# Altium footprint library con-amp.PCBLIB: 295 footprints (part 18 of 19)
Each footprint in its own frame and in the unit in brackets; x right, y up, seen from the top. Pads: shape width x height; smd on the part's side, far side on the other; paste and mask are expansions set on the pad; w line width, h text height; cw(c..) or ccw(c..) is an arc to the next point about the centre after c.
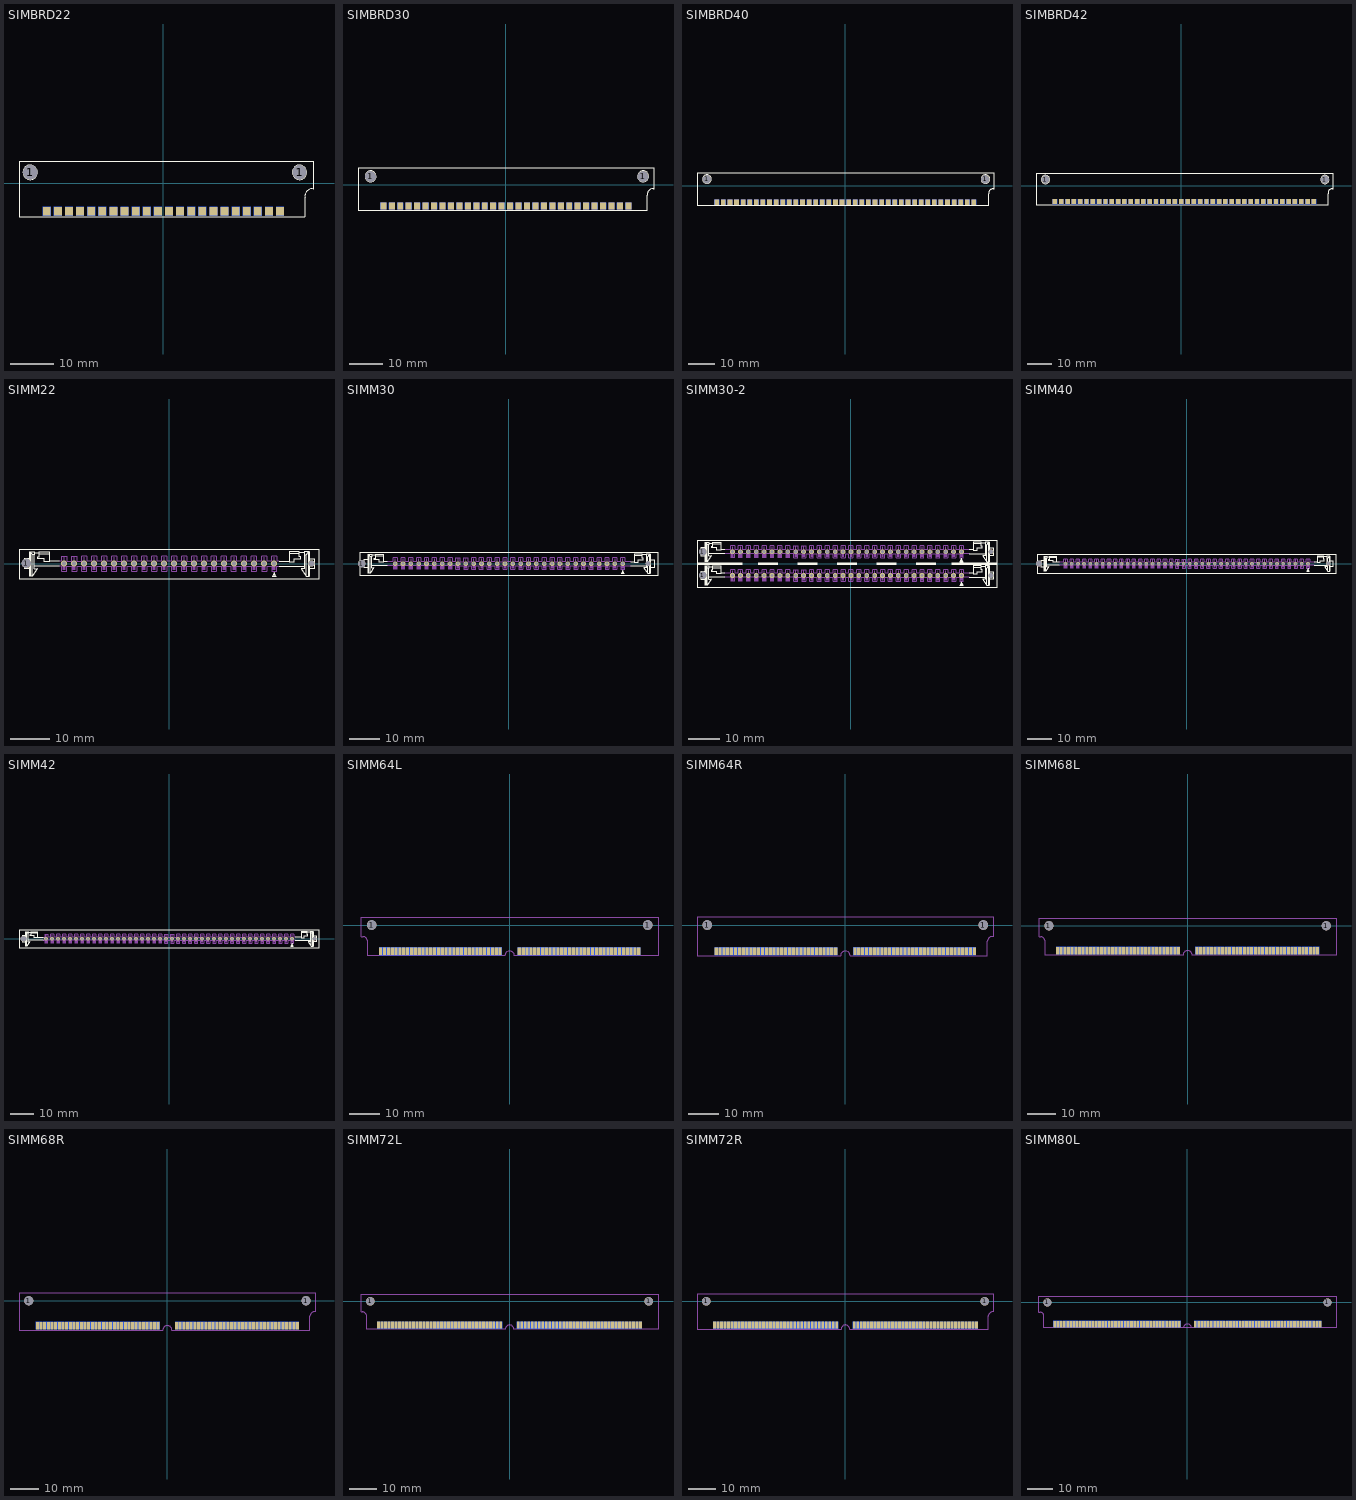
[diagram p17: the footprints below, top view; thin cyan lines are the x and y axes]

## SIMBRD22 [mil]
pads (46):
  round 130 hole 130: 1(-1200,100) 1(1225,100)
  rect 70x80 smd far side: 1B(1050,-250) 2B(950,-250) 3B(850,-250) 4B(750,-250) 5B(650,-250) 6B(550,-250) 7B(450,-250) 8B(350,-250) 9B(250,-250) 10B(150,-250) 11B(50,-250) 12B(-50,-250) 13B(-150,-250) 14B(-250,-250) 15B(-350,-250) 16B(-450,-250) 17B(-550,-250) 18B(-650,-250) 19B(-750,-250) 20B(-850,-250) 21B(-950,-250) 22B(-1050,-250)
  rect 70x80 smd: 1T(1050,-250) 2T(950,-250) 3T(850,-250) 4T(750,-250) 5T(650,-250) 6T(550,-250) 7T(450,-250) 8T(350,-250) 9T(250,-250) 10T(150,-250) 11T(50,-250) 12T(-50,-250) 13T(-150,-250) 14T(-250,-250) 15T(-350,-250) 16T(-450,-250) 17T(-550,-250) 18T(-650,-250) 19T(-750,-250) 20T(-850,-250) 21T(-950,-250) 22T(-1050,-250)
Top Overlay:
  circle w6: c1225,100 r65
  circle w6: c-1200,100 r65
  lines w6: 1274,-300 -1300,-300 -1300,200 1350,200 1350,-50 ccw(c1337,-112) 1275,-125 1275,-300
Mechanical 16:
  rectangle: -1085,-290 -1015,-210
  rectangle: -985,-290 -915,-210
  rectangle: -885,-290 -815,-210
  rectangle: -785,-290 -715,-210
  rectangle: -685,-290 -615,-210
  rectangle: -585,-290 -515,-210
  rectangle: -485,-290 -415,-210
  rectangle: -385,-290 -315,-210
  rectangle: -285,-290 -215,-210
  rectangle: -185,-290 -115,-210
  rectangle: -85,-290 -15,-210
  rectangle: 15,-290 85,-210
  rectangle: 115,-290 185,-210
  rectangle: 215,-290 285,-210
  rectangle: 315,-290 385,-210
  rectangle: 415,-290 485,-210
  rectangle: 515,-290 585,-210
  rectangle: 615,-290 685,-210
  rectangle: 715,-290 785,-210
  rectangle: 815,-290 885,-210
  rectangle: 915,-290 985,-210
  rectangle: 1015,-290 1085,-210

## SIMBRD30 [mil]
pads (62):
  round 130 hole 130: 1(-1600,100) 1(1625,100)
  rect 70x80 smd far side: 1B(1450,-250) 2B(1350,-250) 3B(1250,-250) 4B(1150,-250) 5B(1050,-250) 6B(950,-250) 7B(850,-250) 8B(750,-250) 9B(650,-250) 10B(550,-250) 11B(450,-250) 12B(350,-250) 13B(250,-250) 14B(150,-250) 15B(50,-250) 16B(-50,-250) 17B(-150,-250) 18B(-250,-250) 19B(-350,-250) 20B(-450,-250) 21B(-550,-250) 22B(-650,-250) 23B(-750,-250) 24B(-850,-250) 25B(-950,-250) 26B(-1050,-250) 27B(-1150,-250) 28B(-1250,-250) 29B(-1350,-250) 30B(-1450,-250)
  rect 70x80 smd: 1T(1450,-250) 2T(1350,-250) 3T(1250,-250) 4T(1150,-250) 5T(1050,-250) 6T(950,-250) 7T(850,-250) 8T(750,-250) 9T(650,-250) 10T(550,-250) 11T(450,-250) 12T(350,-250) 13T(250,-250) 14T(150,-250) 15T(50,-250) 16T(-50,-250) 17T(-150,-250) 18T(-250,-250) 19T(-350,-250) 20T(-450,-250) 21T(-550,-250) 22T(-650,-250) 23T(-750,-250) 24T(-850,-250) 25T(-950,-250) 26T(-1050,-250) 27T(-1150,-250) 28T(-1250,-250) 29T(-1350,-250) 30T(-1450,-250)
Top Overlay:
  circle w6: c-1600,100 r65
  circle w6: c1625,100 r65
  lines w6: 1674,-300 -1750,-300 -1750,200 1750,200 1750,-50 ccw(c1737,-112) 1675,-125 1675,-300
Mechanical 16:
  rectangle: -1485,-290 -1415,-210
  rectangle: -1385,-290 -1315,-210
  rectangle: -1285,-290 -1215,-210
  rectangle: -1185,-290 -1115,-210
  rectangle: -1085,-290 -1015,-210
  rectangle: -985,-290 -915,-210
  rectangle: -885,-290 -815,-210
  rectangle: -785,-290 -715,-210
  rectangle: -685,-290 -615,-210
  rectangle: -585,-290 -515,-210
  rectangle: -485,-290 -415,-210
  rectangle: -385,-290 -315,-210
  rectangle: -285,-290 -215,-210
  rectangle: -185,-290 -115,-210
  rectangle: -85,-290 -15,-210
  rectangle: 15,-290 85,-210
  rectangle: 115,-290 185,-210
  rectangle: 215,-290 285,-210
  rectangle: 315,-290 385,-210
  rectangle: 415,-290 485,-210
  rectangle: 515,-290 585,-210
  rectangle: 615,-290 685,-210
  rectangle: 715,-290 785,-210
  rectangle: 815,-290 885,-210
  rectangle: 915,-290 985,-210
  rectangle: 1015,-290 1085,-210
  rectangle: 1115,-290 1185,-210
  rectangle: 1215,-290 1285,-210
  rectangle: 1315,-290 1385,-210
  rectangle: 1415,-290 1485,-210

## SIMBRD40 [mil]
pads (82):
  round 130 hole 130: 1(-2100,100) 1(2125,100)
  rect 70x80 smd far side: 1B(1950,-250) 2B(1850,-250) 3B(1750,-250) 4B(1650,-250) 5B(1550,-250) 6B(1450,-250) 7B(1350,-250) 8B(1250,-250) 9B(1150,-250) 10B(1050,-250) 11B(950,-250) 12B(850,-250) 13B(750,-250) 14B(650,-250) 15B(550,-250) 16B(450,-250) 17B(350,-250) 18B(250,-250) 19B(150,-250) 20B(50,-250) 21B(-50,-250) 22B(-150,-250) 23B(-250,-250) 24B(-350,-250) 25B(-450,-250) 26B(-550,-250) 27B(-650,-250) 28B(-750,-250) 29B(-850,-250) 30B(-950,-250) 31B(-1050,-250) 32B(-1150,-250) 33B(-1250,-250) 34B(-1350,-250) 35B(-1450,-250) 36B(-1550,-250) 37B(-1650,-250) 38B(-1750,-250) 39B(-1850,-250) 40B(-1950,-250)
  rect 70x80 smd: 1T(1950,-250) 2T(1850,-250) 3T(1750,-250) 4T(1650,-250) 5T(1550,-250) 6T(1450,-250) 7T(1350,-250) 8T(1250,-250) 9T(1150,-250) 10T(1050,-250) 11T(950,-250) 12T(850,-250) 13T(750,-250) 14T(650,-250) 15T(550,-250) 16T(450,-250) 17T(350,-250) 18T(250,-250) 19T(150,-250) 20T(50,-250) 21T(-50,-250) 22T(-150,-250) 23T(-250,-250) 24T(-350,-250) 25T(-450,-250) 26T(-550,-250) 27T(-650,-250) 28T(-750,-250) 29T(-850,-250) 30T(-950,-250) 31T(-1050,-250) 32T(-1150,-250) 33T(-1250,-250) 34T(-1350,-250) 35T(-1450,-250) 36T(-1550,-250) 37T(-1650,-250) 38T(-1750,-250) 39T(-1850,-250) 40T(-1950,-250)
Top Overlay:
  circle w6: c-2100,100 r65
  circle w6: c2125,100 r65
  lines w6: 2174,-300 -2250,-300 -2250,200 2250,200 2250,-50 ccw(c2237,-112) 2175,-125 2175,-300
Mechanical 16:
  rectangle: -1985,-290 -1915,-210
  rectangle: -1885,-290 -1815,-210
  rectangle: -1785,-290 -1715,-210
  rectangle: -1685,-290 -1615,-210
  rectangle: -1585,-290 -1515,-210
  rectangle: -1485,-290 -1415,-210
  rectangle: -1385,-290 -1315,-210
  rectangle: -1285,-290 -1215,-210
  rectangle: -1185,-290 -1115,-210
  rectangle: -1085,-290 -1015,-210
  rectangle: -985,-290 -915,-210
  rectangle: -885,-290 -815,-210
  rectangle: -785,-290 -715,-210
  rectangle: -685,-290 -615,-210
  rectangle: -585,-290 -515,-210
  rectangle: -485,-290 -415,-210
  rectangle: -385,-290 -315,-210
  rectangle: -285,-290 -215,-210
  rectangle: -185,-290 -115,-210
  rectangle: -85,-290 -15,-210
  rectangle: 15,-290 85,-210
  rectangle: 115,-290 185,-210
  rectangle: 215,-290 285,-210
  rectangle: 315,-290 385,-210
  rectangle: 415,-290 485,-210
  rectangle: 515,-290 585,-210
  rectangle: 1915,-290 1985,-210
  rectangle: 615,-290 685,-210
  rectangle: 715,-290 785,-210
  rectangle: 815,-290 885,-210
  rectangle: 915,-290 985,-210
  rectangle: 1015,-290 1085,-210
  rectangle: 1115,-290 1185,-210
  rectangle: 1215,-290 1285,-210
  rectangle: 1315,-290 1385,-210
  rectangle: 1415,-290 1485,-210
  rectangle: 1515,-290 1585,-210
  rectangle: 1615,-290 1685,-210
  rectangle: 1715,-290 1785,-210
  rectangle: 1815,-290 1885,-210

## SIMBRD42 [mil]
pads (86):
  round 130 hole 130: 1(-2150,100) 1(2275,100)
  rect 70x80 smd far side: 1B(2100,-250) 2B(2000,-250) 3B(1900,-250) 4B(1800,-250) 5B(1700,-250) 6B(1600,-250) 7B(1500,-250) 8B(1400,-250) 9B(1300,-250) 10B(1200,-250) 11B(1100,-250) 12B(1000,-250) 13B(900,-250) 14B(800,-250) 15B(700,-250) 16B(600,-250) 17B(500,-250) 18B(400,-250) 19B(300,-250) 20B(200,-250) 21B(100,-250) 22B(0,-250) 23B(-100,-250) 24B(-200,-250) 25B(-300,-250) 26B(-400,-250) 27B(-500,-250) 28B(-600,-250) 29B(-700,-250) 30B(-800,-250) 31B(-900,-250) 32B(-1000,-250) 33B(-1100,-250) 34B(-1200,-250) 35B(-1300,-250) 36B(-1400,-250) 37B(-1500,-250) 38B(-1600,-250) 39B(-1700,-250) 40B(-1800,-250) 41B(-1900,-250) 42B(-2000,-250)
  rect 70x80 smd: 1T(2100,-250) 2T(2000,-250) 3T(1900,-250) 4T(1800,-250) 5T(1700,-250) 6T(1600,-250) 7T(1500,-250) 8T(1400,-250) 9T(1300,-250) 10T(1200,-250) 11T(1100,-250) 12T(1000,-250) 13T(900,-250) 14T(800,-250) 15T(700,-250) 16T(600,-250) 17T(500,-250) 18T(400,-250) 19T(300,-250) 20T(200,-250) 21T(100,-250) 22T(0,-250) 23T(-100,-250) 24T(-200,-250) 25T(-300,-250) 26T(-400,-250) 27T(-500,-250) 28T(-600,-250) 29T(-700,-250) 30T(-800,-250) 31T(-900,-250) 32T(-1000,-250) 33T(-1100,-250) 34T(-1200,-250) 35T(-1300,-250) 36T(-1400,-250) 37T(-1500,-250) 38T(-1600,-250) 39T(-1700,-250) 40T(-1800,-250) 41T(-1900,-250) 42T(-2000,-250)
Top Overlay:
  circle w6: c2275,100 r65
  circle w6: c-2150,100 r65
  lines w6: 2324,-300 -2300,-300 -2300,200 2400,200 2400,-50 ccw(c2387,-112) 2325,-125 2325,-300
Mechanical 16:
  rectangle: -2035,-290 -1965,-210
  rectangle: -1935,-290 -1865,-210
  rectangle: -1835,-290 -1765,-210
  rectangle: -1735,-290 -1665,-210
  rectangle: -1635,-290 -1565,-210
  rectangle: -1535,-290 -1465,-210
  rectangle: -1435,-290 -1365,-210
  rectangle: -1335,-290 -1265,-210
  rectangle: -1235,-290 -1165,-210
  rectangle: -1135,-290 -1065,-210
  rectangle: -1035,-290 -965,-210
  rectangle: -935,-290 -865,-210
  rectangle: -835,-290 -765,-210
  rectangle: -735,-290 -665,-210
  rectangle: -635,-290 -565,-210
  rectangle: -535,-290 -465,-210
  rectangle: -435,-290 -365,-210
  rectangle: -335,-290 -265,-210
  rectangle: -235,-290 -165,-210
  rectangle: -135,-290 -65,-210
  rectangle: -35,-290 35,-210
  rectangle: 65,-290 135,-210
  rectangle: 165,-290 235,-210
  rectangle: 265,-290 335,-210
  rectangle: 365,-290 435,-210
  rectangle: 465,-290 535,-210
  rectangle: 1865,-290 1935,-210
  rectangle: 565,-290 635,-210
  rectangle: 665,-290 735,-210
  rectangle: 765,-290 835,-210
  rectangle: 865,-290 935,-210
  rectangle: 965,-290 1035,-210
  rectangle: 1065,-290 1135,-210
  rectangle: 1165,-290 1235,-210
  rectangle: 1265,-290 1335,-210
  rectangle: 1365,-290 1435,-210
  rectangle: 1465,-290 1535,-210
  rectangle: 1565,-290 1635,-210
  rectangle: 1665,-290 1735,-210
  rectangle: 1765,-290 1835,-210
  rectangle: 1965,-290 2035,-210
  rectangle: 2065,-290 2135,-210

## SIMM22 [mil]
pads (24):
  round 95 hole 95: 1(-1426,1)
  round 60 hole 40: 1(1050,0) 2(950,0) 3(850,0) 4(750,0) 5(650,0) 6(550,0) 7(450,0) 8(350,0) 9(250,0) 10(150,0) 11(50,0) 12(-50,0) 13(-150,0) 14(-250,0) 15(-350,0) 16(-450,0) 17(-550,0) 18(-650,0) 19(-750,0) 20(-850,0) 21(-950,0) 22(-1050,0)
  round 63 hole 63: 1(1425,0)
Top Overlay:
  lines w2: -1350,-25 -1100,-25 ; -1200,25 -1100,25 ; 1100,-25 1348,-25 ; 1100,25 1198,25
  lines w6: -1400,-49 -1450,-49 -1450,50 -1400,50 ; 1400,50 1451,50 1451,-51 1404,-51 ; -1390,-125 -1370,-125 ; -1390,-125 -1390,120 ; -1390,-125 -1400,-125 -1400,120 -1390,120 ; -1390,120 -1350,120 -1350,110 ; -1390,120 -1370,90 ; -1370,-125 -1370,90 ; -1370,-125 -1320,-50 -1350,-50 -1350,-25 -1350,90 ; -1370,90 -1350,90 ; -1350,90 -1350,110 ; -1350,110 -1300,110 ; -1300,100 -1300,70 -1315,70 -1315,50 -1250,50 -1250,20 -1200,20 -1200,25 -1200,100 ; -1300,100 -1200,100 ; -1300,100 -1300,110 ; -1300,110 -1300,120 -1200,120 -1200,100 ; 1200,100 1200,120 1300,120 1300,110 ; 1200,100 1300,100 ; 1200,100 1200,20 1250,20 1250,50 1315,50 1315,70 1300,70 1300,100 ; 1300,100 1300,110 ; 1300,110 1350,110 ; 1350,90 1370,90 ; 1350,90 1350,110 ; 1350,90 1350,-50 1320,-50 1370,-125 ; 1350,110 1350,120 1390,120 ; 1370,-125 1390,-125 ; 1370,-125 1370,90 ; 1370,90 1390,120 ; 1390,-125 1390,120 ; 1390,-125 1400,-125 1400,120 1390,120 ; -1500,-150 -1500,140 1500,140 1500,-150 -1500,-150
  lines w10: 1030,-125 1050,-85 1070,-125 1030,-125
  lines w24: 1050,-115 1050,-110
Mechanical 12:
  text "2.4" at -1475,-100 h77.5
Mechanical 16:
  drawing of 222 lines, arcs and shapes, not listed

## SIMM30 [mil]
pads (32):
  round 95 hole 95: 1(-1876,1)
  oct 60x60 hole 40: 1(1450,0) 2(1350,0) 3(1250,0) 4(1150,0) 5(1050,0) 6(950,0) 7(850,0) 8(750,0) 9(650,0) 10(550,0) 11(450,0) 12(350,0) 13(250,0) 14(150,0) 15(50,0) 16(-50,0) 17(-150,0) 18(-250,0) 19(-350,0) 20(-450,0) 21(-550,0) 22(-650,0) 23(-750,0) 24(-850,0) 25(-950,0) 26(-1050,0) 27(-1150,0) 28(-1250,0) 29(-1350,0) 30(-1450,0)
  round 63 hole 63: 1(1775,0)
Top Overlay:
  lines w2: -1750,-25 -1550,-25 ; -1600,25 -1550,25 ; 1550,-25 1750,-25 ; 1550,25 1600,25
  lines w6: -1800,-49 -1850,-49 -1850,50 -1800,50 ; 1800,50 1851,50 1851,-51 1804,-51 ; -1790,-125 -1770,-125 ; -1790,-125 -1790,120 ; -1790,-125 -1800,-125 -1800,120 -1790,120 ; -1790,120 -1750,120 -1750,110 ; -1790,120 -1770,90 ; -1770,-125 -1770,90 ; -1770,-125 -1720,-50 -1750,-50 -1750,-25 -1750,90 ; -1770,90 -1750,90 ; -1750,90 -1750,110 ; -1750,110 -1700,110 ; -1700,100 -1700,70 -1715,70 -1715,50 -1650,50 -1650,20 -1600,20 -1600,25 -1600,100 ; -1700,100 -1600,100 ; -1700,100 -1700,110 ; -1700,110 -1700,120 -1600,120 -1600,100 ; 1600,100 1600,120 1700,120 1700,110 ; 1600,100 1700,100 ; 1600,100 1600,25 1600,20 1650,20 1650,50 1715,50 1715,70 1700,70 1700,100 ; 1700,100 1700,110 ; 1700,110 1750,110 ; 1750,90 1770,90 ; 1750,90 1750,110 ; 1750,90 1750,-25 1750,-50 1720,-50 1770,-125 ; 1750,110 1750,120 1790,120 ; 1770,-125 1790,-125 ; 1770,-125 1770,90 ; 1770,90 1790,120 ; 1790,-125 1790,120 ; 1790,-125 1800,-125 1800,120 1790,120 ; -1900,-150 -1900,140 1900,140 1900,-150 -1900,-150
  lines w10: 1430,-125 1450,-85 1470,-125 1430,-125
  lines w24: 1450,-115 1450,-110
Mechanical 12:
  text "2.4" at -1925,-100 h77.5
Mechanical 16:
  drawing of 302 lines, arcs and shapes, not listed

## SIMM30-2 [mil]
pads (64):
  round 95 hole 95: 1(-1876,-149) 1(-1876,151)
  oct 60x60 hole 40: 1(1400,150) 1A(1400,-150) 2(1300,150) 2A(1300,-150) 3(1200,150) 3A(1200,-150) 4(1100,150) 4A(1100,-150) 5(1000,150) 5A(1000,-150) 6(900,150) 6A(900,-150) 7(800,150) 7A(800,-150) 8(700,150) 8A(700,-150) 9(600,150) 9A(600,-150) 10(500,150) 10A(500,-150) 11(400,150) 11A(400,-150) 12(300,150) 12A(300,-150) 13(200,150) 13A(200,-150) 14(100,150) 14A(100,-150) 15(0,150) 15A(0,-150) 16(-100,150) 16A(-100,-150) 17(-200,150) 17A(-200,-150) 18(-300,150) 18A(-300,-150) 19(-400,150) 19A(-400,-150) 20(-500,150) 20A(-500,-150) 21(-600,150) 21A(-600,-150) 22(-700,150) 22A(-700,-150) 23(-800,150) 23A(-800,-150) 24(-900,150) 24A(-900,-150) 25(-1000,150) 25A(-1000,-150) 26(-1100,150) 26A(-1100,-150) 27(-1200,150) 27A(-1200,-150) 28(-1300,150) 28A(-1300,-150) 29(-1400,150) 29A(-1400,-150) 30(-1500,150) 30A(-1500,-150)
  round 63 hole 63: 1(1775,-150) 1(1775,150)
Top Overlay:
  drawing of 154 lines, arcs and shapes, not listed
Mechanical 16:
  drawing of 604 lines, arcs and shapes, not listed

## SIMM40 [mil]
pads (42):
  round 95 hole 95: 1(-2376,1)
  oct 60x60 hole 40: 1(1950,0) 2(1850,0) 3(1750,0) 4(1650,0) 5(1550,0) 6(1450,0) 7(1350,0) 8(1250,0) 9(1150,0) 10(1050,0) 11(950,0) 12(850,0) 13(750,0) 14(650,0) 15(550,0) 16(450,0) 17(350,0) 18(250,0) 19(150,0) 20(50,0) 21(-50,0) 22(-150,0) 23(-250,0) 24(-350,0) 25(-450,0) 26(-550,0) 27(-650,0) 28(-750,0) 29(-850,0) 30(-950,0) 31(-1050,0) 32(-1150,0) 33(-1250,0) 34(-1350,0) 35(-1450,0) 36(-1550,0) 37(-1650,0) 38(-1750,0) 39(-1850,0) 40(-1950,0)
  round 63 hole 63: 1(2275,0)
Top Overlay:
  lines w2: -2250,-25 -2050,-25 ; -2100,25 -2050,25 ; 2050,-25 2250,-25 ; 2050,25 2100,25
  lines w6: -2300,-49 -2350,-49 -2350,50 -2300,50 ; 2300,50 2351,50 2351,-51 2304,-51 ; -2290,-125 -2270,-125 ; -2290,-125 -2290,120 ; -2290,-125 -2300,-125 -2300,120 -2290,120 ; -2290,120 -2250,120 -2250,110 ; -2290,120 -2270,90 ; -2270,-125 -2270,90 ; -2270,-125 -2220,-50 -2250,-50 -2250,-25 -2250,90 ; -2270,90 -2250,90 ; -2250,90 -2250,110 ; -2250,110 -2200,110 ; -2200,100 -2200,70 -2215,70 -2215,50 -2150,50 -2150,20 -2100,20 -2100,25 -2100,100 ; -2200,100 -2100,100 ; -2200,100 -2200,110 ; -2200,110 -2200,120 -2100,120 -2100,100 ; 2100,100 2100,120 2200,120 2200,110 ; 2100,100 2200,100 ; 2100,100 2100,25 2100,20 2150,20 2150,50 2215,50 2215,70 2200,70 2200,100 ; 2200,100 2200,110 ; 2200,110 2250,110 ; 2250,90 2270,90 ; 2250,90 2250,110 ; 2250,90 2250,-25 2250,-50 2220,-50 2270,-125 ; 2250,110 2250,120 2290,120 ; 2270,-125 2290,-125 ; 2270,-125 2270,90 ; 2270,90 2290,120 ; 2290,-125 2290,120 ; 2290,-125 2300,-125 2300,120 2290,120 ; -2400,-150 -2400,140 2400,140 2400,-150 -2400,-150
  lines w10: 1930,-125 1950,-85 1970,-125 1930,-125
  lines w24: 1950,-115 1950,-110
Mechanical 12:
  text "2.4" at -2425,-100 h77.5
Mechanical 16:
  drawing of 402 lines, arcs and shapes, not listed

## SIMM42 [mil]
pads (44):
  round 95 hole 95: 1(-2426,1)
  oct 60x60 hole 40: 1(2050,0) 2(1950,0) 3(1850,0) 4(1750,0) 5(1650,0) 6(1550,0) 7(1450,0) 8(1350,0) 9(1250,0) 10(1150,0) 11(1050,0) 12(950,0) 13(850,0) 14(750,0) 15(650,0) 16(550,0) 17(450,0) 18(350,0) 19(250,0) 20(150,0) 21(50,0) 22(-50,0) 23(-150,0) 24(-250,0) 25(-350,0) 26(-450,0) 27(-550,0) 28(-650,0) 29(-750,0) 30(-850,0) 31(-950,0) 32(-1050,0) 33(-1150,0) 34(-1250,0) 35(-1350,0) 36(-1450,0) 37(-1550,0) 38(-1650,0) 39(-1750,0) 40(-1850,0) 41(-1950,0) 42(-2050,0)
  round 63 hole 63: 1(2425,0)
Top Overlay:
  lines w2: -2350,-25 -2100,-25 ; -2200,25 -2100,25 ; 2100,-25 2350,-25 ; 2100,25 2200,25
  lines w6: -2400,-49 -2450,-49 -2450,50 -2400,50 ; 2400,50 2451,50 2451,-51 2404,-51 ; -2390,-125 -2370,-125 ; -2390,-125 -2390,120 ; -2390,-125 -2400,-125 -2400,120 -2390,120 ; -2390,120 -2350,120 -2350,110 ; -2390,120 -2370,90 ; -2370,-125 -2370,90 ; -2370,-125 -2320,-50 -2350,-50 -2350,-25 -2350,90 ; -2370,90 -2350,90 ; -2350,90 -2350,110 ; -2350,110 -2300,110 ; -2300,100 -2300,70 -2315,70 -2315,50 -2250,50 -2250,20 -2200,20 -2200,25 -2200,100 ; -2300,100 -2200,100 ; -2300,100 -2300,110 ; -2300,110 -2300,120 -2200,120 -2200,100 ; 2200,100 2200,120 2300,120 2300,110 ; 2200,100 2300,100 ; 2200,100 2200,25 2200,20 2250,20 2250,50 2315,50 2315,70 2300,70 2300,100 ; 2300,100 2300,110 ; 2300,110 2350,110 ; 2350,90 2370,90 ; 2350,90 2350,110 ; 2350,90 2350,-25 2350,-50 2320,-50 2370,-125 ; 2350,110 2350,120 2390,120 ; 2370,-125 2390,-125 ; 2370,-125 2370,90 ; 2370,90 2390,120 ; 2390,-125 2390,120 ; 2390,-125 2400,-125 2400,120 2390,120 ; -2500,-150 -2500,140 2500,140 2500,-150 -2500,-150
  lines w10: 2030,-125 2050,-85 2070,-125 2030,-125
  lines w24: 2050,-115 2050,-110
Mechanical 12:
  text "2.4" at -2475,-125 h77.5
Mechanical 16:
  drawing of 422 lines, arcs and shapes, not listed

## SIMM64L [mil]
pads (130):
  round 125 hole 125: 1(-1792,0) 1(1792,0)
  rect 41x100 smd: 1(-1675,-340) 2(-1625,-340) 3(-1575,-340) 4(-1525,-340) 5(-1475,-340) 6(-1425,-340) 7(-1375,-340) 8(-1325,-340) 9(-1275,-340) 10(-1225,-340) 11(-1175,-340) 12(-1125,-340) 13(-1075,-340) 14(-1025,-340) 15(-975,-340) 16(-925,-340) 17(-875,-340) 18(-825,-340) 19(-775,-340) 20(-725,-340) 21(-675,-340) 22(-625,-340) 23(-575,-340) 24(-525,-340) 25(-475,-340) 26(-425,-340) 27(-375,-340) 28(-325,-340) 29(-275,-340) 30(-225,-340) 31(-175,-340) 32(-125,-340) 33(125,-340) 34(175,-340) 35(225,-340) 36(275,-340) 37(325,-340) 38(375,-340) 39(425,-340) 40(475,-340) 41(525,-340) 42(575,-340) 43(625,-340) 44(675,-340) 45(725,-340) 46(775,-340) 47(825,-340) 48(875,-340) 49(925,-340) 50(975,-340) 51(1025,-340) 52(1075,-340) 53(1125,-340) 54(1175,-340) 55(1225,-340) 56(1275,-340) 57(1325,-340) 58(1375,-340) 59(1425,-340) 60(1475,-340) 61(1525,-340) 62(1575,-340) 63(1625,-340) 64(1675,-340)
  rect 41x100 smd far side: 65(-1675,-340) 66(-1625,-340) 67(-1575,-340) 68(-1525,-340) 69(-1475,-340) 70(-1425,-340) 71(-1375,-340) 72(-1325,-340) 73(-1275,-340) 74(-1225,-340) 75(-1175,-340) 76(-1125,-340) 77(-1075,-340) 78(-1025,-340) 79(-975,-340) 80(-925,-340) 81(-875,-340) 82(-825,-340) 83(-775,-340) 84(-725,-340) 85(-675,-340) 86(-625,-340) 87(-575,-340) 88(-525,-340) 89(-475,-340) 90(-425,-340) 91(-375,-340) 92(-325,-340) 93(-275,-340) 94(-225,-340) 95(-175,-340) 96(-125,-340) 97(125,-340) 98(175,-340) 99(225,-340) 100(275,-340) 101(325,-340) 102(375,-340) 103(425,-340) 104(475,-340) 105(525,-340) 106(575,-340) 107(625,-340) 108(675,-340) 109(725,-340) 110(775,-340) 111(825,-340) 112(875,-340) 113(925,-340) 114(975,-340) 115(1025,-340) 116(1075,-340) 117(1125,-340) 118(1175,-340) 119(1225,-340) 120(1275,-340) 121(1325,-340) 122(1375,-340) 123(1425,-340) 124(1475,-340) 125(1525,-340) 126(1575,-340) 127(1625,-340) 128(1675,-340)
Mechanical 1:
  lines w0: -1907,-150 cw(c-1907,-212) -1845,-212 ; -1903,-150 -1925,-150 -1925,100 1925,100 1925,-400 62,-400 ccw(c0,-400) -62,-400 -1845,-400 -1845,-209

## SIMM64R [mil]
pads (130):
  round 125 hole 125: 1(-1792,0) 1(1792,0)
  rect 41x100 smd: 1(1675,-340) 2(1625,-340) 3(1575,-340) 4(1525,-340) 5(1475,-340) 6(1425,-340) 7(1375,-340) 8(1325,-340) 9(1275,-340) 10(1225,-340) 11(1175,-340) 12(1125,-340) 13(1075,-340) 14(1025,-340) 15(975,-340) 16(925,-340) 17(875,-340) 18(825,-340) 19(775,-340) 20(725,-340) 21(675,-340) 22(625,-340) 23(575,-340) 24(525,-340) 25(475,-340) 26(425,-340) 27(375,-340) 28(325,-340) 29(275,-340) 30(225,-340) 31(175,-340) 32(125,-340) 33(-125,-340) 34(-175,-340) 35(-225,-340) 36(-275,-340) 37(-325,-340) 38(-375,-340) 39(-425,-340) 40(-475,-340) 41(-525,-340) 42(-575,-340) 43(-625,-340) 44(-675,-340) 45(-725,-340) 46(-775,-340) 47(-825,-340) 48(-875,-340) 49(-925,-340) 50(-975,-340) 51(-1025,-340) 52(-1075,-340) 53(-1125,-340) 54(-1175,-340) 55(-1225,-340) 56(-1275,-340) 57(-1325,-340) 58(-1375,-340) 59(-1425,-340) 60(-1475,-340) 61(-1525,-340) 62(-1575,-340) 63(-1625,-340) 64(-1675,-340)
  rect 41x100 smd far side: 65(1675,-340) 66(1625,-340) 67(1575,-340) 68(1525,-340) 69(1475,-340) 70(1425,-340) 71(1375,-340) 72(1325,-340) 73(1275,-340) 74(1225,-340) 75(1175,-340) 76(1125,-340) 77(1075,-340) 78(1025,-340) 79(975,-340) 80(925,-340) 81(875,-340) 82(825,-340) 83(775,-340) 84(725,-340) 85(675,-340) 86(625,-340) 87(575,-340) 88(525,-340) 89(475,-340) 90(425,-340) 91(375,-340) 92(325,-340) 93(275,-340) 94(225,-340) 95(175,-340) 96(125,-340) 97(-125,-340) 98(-175,-340) 99(-225,-340) 100(-275,-340) 101(-325,-340) 102(-375,-340) 103(-425,-340) 104(-475,-340) 105(-525,-340) 106(-575,-340) 107(-625,-340) 108(-675,-340) 109(-725,-340) 110(-775,-340) 111(-825,-340) 112(-875,-340) 113(-925,-340) 114(-975,-340) 115(-1025,-340) 116(-1075,-340) 117(-1125,-340) 118(-1175,-340) 119(-1225,-340) 120(-1275,-340) 121(-1325,-340) 122(-1375,-340) 123(-1425,-340) 124(-1475,-340) 125(-1525,-340) 126(-1575,-340) 127(-1625,-340) 128(-1675,-340)
Mechanical 1:
  lines w0: 1845,-212 cw(c1907,-212) 1907,-150 ; 1845,-209 1845,-400 62,-400 ccw(c0,-400) -62,-400 -1925,-400 -1925,100 1925,100 1925,-150 1903,-150

## SIMM68L [mil]
pads (138):
  round 125 hole 125: 1(-1892,0) 1(1892,0)
  rect 41x100 smd: 1(-1775,-340) 2(-1725,-340) 3(-1675,-340) 4(-1625,-340) 5(-1575,-340) 6(-1525,-340) 7(-1475,-340) 8(-1425,-340) 9(-1375,-340) 10(-1325,-340) 11(-1275,-340) 12(-1225,-340) 13(-1175,-340) 14(-1125,-340) 15(-1075,-340) 16(-1025,-340) 17(-975,-340) 18(-925,-340) 19(-875,-340) 20(-825,-340) 21(-775,-340) 22(-725,-340) 23(-675,-340) 24(-625,-340) 25(-575,-340) 26(-525,-340) 27(-475,-340) 28(-425,-340) 29(-375,-340) 30(-325,-340) 31(-275,-340) 32(-225,-340) 33(-175,-340) 34(-125,-340) 35(125,-340) 36(175,-340) 37(225,-340) 38(275,-340) 39(325,-340) 40(375,-340) 41(425,-340) 42(475,-340) 43(525,-340) 44(575,-340) 45(625,-340) 46(675,-340) 47(725,-340) 48(775,-340) 49(825,-340) 50(875,-340) 51(925,-340) 52(975,-340) 53(1025,-340) 54(1075,-340) 55(1125,-340) 56(1175,-340) 57(1225,-340) 58(1275,-340) 59(1325,-340) 60(1375,-340) 61(1425,-340) 62(1475,-340) 63(1525,-340) 64(1575,-340) 65(1625,-340) 66(1675,-340) 67(1725,-340) 68(1775,-340)
  rect 41x100 smd far side: 69(-1775,-340) 70(-1725,-340) 71(-1675,-340) 72(-1625,-340) 73(-1575,-340) 74(-1525,-340) 75(-1475,-340) 76(-1425,-340) 77(-1375,-340) 78(-1325,-340) 79(-1275,-340) 80(-1225,-340) 81(-1175,-340) 82(-1125,-340) 83(-1075,-340) 84(-1025,-340) 85(-975,-340) 86(-925,-340) 87(-875,-340) 88(-825,-340) 89(-775,-340) 90(-725,-340) 91(-675,-340) 92(-625,-340) 93(-575,-340) 94(-525,-340) 95(-475,-340) 96(-425,-340) 97(-375,-340) 98(-325,-340) 99(-275,-340) 100(-225,-340) 101(-175,-340) 102(-125,-340) 103(125,-340) 104(175,-340) 105(225,-340) 106(275,-340) 107(325,-340) 108(375,-340) 109(425,-340) 110(475,-340) 111(525,-340) 112(575,-340) 113(625,-340) 114(675,-340) 115(725,-340) 116(775,-340) 117(825,-340) 118(875,-340) 119(925,-340) 120(975,-340) 121(1025,-340) 122(1075,-340) 123(1125,-340) 124(1175,-340) 125(1225,-340) 126(1275,-340) 127(1325,-340) 128(1375,-340) 129(1425,-340) 130(1475,-340) 131(1525,-340) 132(1575,-340) 133(1625,-340) 134(1675,-340) 135(1725,-340) 136(1775,-340)
Mechanical 1:
  lines w0: -2007,-150 cw(c-2007,-212) -1945,-212 ; -2003,-150 -2025,-150 -2025,100 2025,100 2025,-400 62,-400 ccw(c0,-400) -62,-400 -1945,-400 -1945,-209

## SIMM68R [mil]
pads (138):
  round 125 hole 125: 1(-1892,0) 1(1892,0)
  rect 41x100 smd: 1(1775,-340) 2(1725,-340) 3(1675,-340) 4(1625,-340) 5(1575,-340) 6(1525,-340) 7(1475,-340) 8(1425,-340) 9(1375,-340) 10(1325,-340) 11(1275,-340) 12(1225,-340) 13(1175,-340) 14(1125,-340) 15(1075,-340) 16(1025,-340) 17(975,-340) 18(925,-340) 19(875,-340) 20(825,-340) 21(775,-340) 22(725,-340) 23(675,-340) 24(625,-340) 25(575,-340) 26(525,-340) 27(475,-340) 28(425,-340) 29(375,-340) 30(325,-340) 31(275,-340) 32(225,-340) 33(175,-340) 34(125,-340) 35(-125,-340) 36(-175,-340) 37(-225,-340) 38(-275,-340) 39(-325,-340) 40(-375,-340) 41(-425,-340) 42(-475,-340) 43(-525,-340) 44(-575,-340) 45(-625,-340) 46(-675,-340) 47(-725,-340) 48(-775,-340) 49(-825,-340) 50(-875,-340) 51(-925,-340) 52(-975,-340) 53(-1025,-340) 54(-1075,-340) 55(-1125,-340) 56(-1175,-340) 57(-1225,-340) 58(-1275,-340) 59(-1325,-340) 60(-1375,-340) 61(-1425,-340) 62(-1475,-340) 63(-1525,-340) 64(-1575,-340) 65(-1625,-340) 66(-1675,-340) 67(-1725,-340) 68(-1775,-340)
  rect 41x100 smd far side: 69(1775,-340) 70(1725,-340) 71(1675,-340) 72(1625,-340) 73(1575,-340) 74(1525,-340) 75(1475,-340) 76(1425,-340) 77(1375,-340) 78(1325,-340) 79(1275,-340) 80(1225,-340) 81(1175,-340) 82(1125,-340) 83(1075,-340) 84(1025,-340) 85(975,-340) 86(925,-340) 87(875,-340) 88(825,-340) 89(775,-340) 90(725,-340) 91(675,-340) 92(625,-340) 93(575,-340) 94(525,-340) 95(475,-340) 96(425,-340) 97(375,-340) 98(325,-340) 99(275,-340) 100(225,-340) 101(175,-340) 102(125,-340) 103(-125,-340) 104(-175,-340) 105(-225,-340) 106(-275,-340) 107(-325,-340) 108(-375,-340) 109(-425,-340) 110(-475,-340) 111(-525,-340) 112(-575,-340) 113(-625,-340) 114(-675,-340) 115(-725,-340) 116(-775,-340) 117(-825,-340) 118(-875,-340) 119(-925,-340) 120(-975,-340) 121(-1025,-340) 122(-1075,-340) 123(-1125,-340) 124(-1175,-340) 125(-1225,-340) 126(-1275,-340) 127(-1325,-340) 128(-1375,-340) 129(-1425,-340) 130(-1475,-340) 131(-1525,-340) 132(-1575,-340) 133(-1625,-340) 134(-1675,-340) 135(-1725,-340) 136(-1775,-340)
Mechanical 1:
  lines w0: 1945,-212 cw(c2007,-212) 2007,-150 ; 1945,-209 1945,-400 62,-400 ccw(c0,-400) -62,-400 -2025,-400 -2025,100 2025,100 2025,-150 2003,-150

## SIMM72L [mil]
pads (146):
  round 125 hole 125: 1(-1992,0) 1(1992,0)
  rect 41x100 smd: 1(-1875,-340) 2(-1825,-340) 3(-1775,-340) 4(-1725,-340) 5(-1675,-340) 6(-1625,-340) 7(-1575,-340) 8(-1525,-340) 9(-1475,-340) 10(-1425,-340) 11(-1375,-340) 12(-1325,-340) 13(-1275,-340) 14(-1225,-340) 15(-1175,-340) 16(-1125,-340) 17(-1075,-340) 18(-1025,-340) 19(-975,-340) 20(-925,-340) 21(-875,-340) 22(-825,-340) 23(-775,-340) 24(-725,-340) 25(-675,-340) 26(-625,-340) 27(-575,-340) 28(-525,-340) 29(-475,-340) 30(-425,-340) 31(-375,-340) 32(-325,-340) 33(-275,-340) 34(-225,-340) 35(-175,-340) 36(-125,-340) 37(125,-340) 38(175,-340) 39(225,-340) 40(275,-340) 41(325,-340) 42(375,-340) 43(425,-340) 44(475,-340) 45(525,-340) 46(575,-340) 47(625,-340) 48(675,-340) 49(725,-340) 50(775,-340) 51(825,-340) 52(875,-340) 53(925,-340) 54(975,-340) 55(1025,-340) 56(1075,-340) 57(1125,-340) 58(1175,-340) 59(1225,-340) 60(1275,-340) 61(1325,-340) 62(1375,-340) 63(1425,-340) 64(1475,-340) 65(1525,-340) 66(1575,-340) 67(1625,-340) 68(1675,-340) 69(1725,-340) 70(1775,-340) 71(1825,-340) 72(1875,-340)
  rect 41x100 smd far side: 73(-1875,-340) 74(-1825,-340) 75(-1775,-340) 76(-1725,-340) 77(-1675,-340) 78(-1625,-340) 79(-1575,-340) 80(-1525,-340) 81(-1475,-340) 82(-1425,-340) 83(-1375,-340) 84(-1325,-340) 85(-1275,-340) 86(-1225,-340) 87(-1175,-340) 88(-1125,-340) 89(-1075,-340) 90(-1025,-340) 91(-975,-340) 92(-925,-340) 93(-875,-340) 94(-825,-340) 95(-775,-340) 96(-725,-340) 97(-675,-340) 98(-625,-340) 99(-575,-340) 100(-525,-340) 101(-475,-340) 102(-425,-340) 103(-375,-340) 104(-325,-340) 105(-275,-340) 106(-225,-340) 107(-175,-340) 108(-125,-340) 109(125,-340) 110(175,-340) 111(225,-340) 112(275,-340) 113(325,-340) 114(375,-340) 115(425,-340) 116(475,-340) 117(525,-340) 118(575,-340) 119(625,-340) 120(675,-340) 121(725,-340) 122(775,-340) 123(825,-340) 124(875,-340) 125(925,-340) 126(975,-340) 127(1025,-340) 128(1075,-340) 129(1125,-340) 130(1175,-340) 131(1225,-340) 132(1275,-340) 133(1325,-340) 134(1375,-340) 135(1425,-340) 136(1475,-340) 137(1525,-340) 138(1575,-340) 139(1625,-340) 140(1675,-340) 141(1725,-340) 142(1775,-340) 143(1825,-340) 144(1875,-340)
Mechanical 1:
  lines w0: -2107,-150 cw(c-2107,-212) -2045,-212 ; -2103,-150 -2125,-150 -2125,100 2125,100 2125,-400 62,-400 ccw(c0,-400) -62,-400 -2045,-400 -2045,-209

## SIMM72R [mil]
pads (146):
  round 125 hole 125: 1(-1992,0) 1(1992,0)
  rect 41x100 smd: 1(1875,-340) 2(1825,-340) 3(1775,-340) 4(1725,-340) 5(1675,-340) 6(1625,-340) 7(1575,-340) 8(1525,-340) 9(1475,-340) 10(1425,-340) 11(1375,-340) 12(1325,-340) 13(1275,-340) 14(1225,-340) 15(1175,-340) 16(1125,-340) 17(1075,-340) 18(1025,-340) 19(975,-340) 20(925,-340) 21(875,-340) 22(825,-340) 23(775,-340) 24(725,-340) 25(675,-340) 26(625,-340) 27(575,-340) 28(525,-340) 29(475,-340) 30(425,-340) 31(375,-340) 32(325,-340) 33(275,-340) 34(225,-340) 35(175,-340) 36(125,-340) 37(-125,-340) 38(-175,-340) 39(-225,-340) 40(-275,-340) 41(-325,-340) 42(-375,-340) 43(-425,-340) 44(-475,-340) 45(-525,-340) 46(-575,-340) 47(-625,-340) 48(-675,-340) 49(-725,-340) 50(-775,-340) 51(-825,-340) 52(-875,-340) 53(-925,-340) 54(-975,-340) 55(-1025,-340) 56(-1075,-340) 57(-1125,-340) 58(-1175,-340) 59(-1225,-340) 60(-1275,-340) 61(-1325,-340) 62(-1375,-340) 63(-1425,-340) 64(-1475,-340) 65(-1525,-340) 66(-1575,-340) 67(-1625,-340) 68(-1675,-340) 69(-1725,-340) 70(-1775,-340) 71(-1825,-340) 72(-1875,-340)
  rect 41x100 smd far side: 73(1875,-340) 74(1825,-340) 75(1775,-340) 76(1725,-340) 77(1675,-340) 78(1625,-340) 79(1575,-340) 80(1525,-340) 81(1475,-340) 82(1425,-340) 83(1375,-340) 84(1325,-340) 85(1275,-340) 86(1225,-340) 87(1175,-340) 88(1125,-340) 89(1075,-340) 90(1025,-340) 91(975,-340) 92(925,-340) 93(875,-340) 94(825,-340) 95(775,-340) 96(725,-340) 97(675,-340) 98(625,-340) 99(575,-340) 100(525,-340) 101(475,-340) 102(425,-340) 103(375,-340) 104(325,-340) 105(275,-340) 106(225,-340) 107(175,-340) 108(125,-340) 109(-125,-340) 110(-175,-340) 111(-225,-340) 112(-275,-340) 113(-325,-340) 114(-375,-340) 115(-425,-340) 116(-475,-340) 117(-525,-340) 118(-575,-340) 119(-625,-340) 120(-675,-340) 121(-725,-340) 122(-775,-340) 123(-825,-340) 124(-875,-340) 125(-925,-340) 126(-975,-340) 127(-1025,-340) 128(-1075,-340) 129(-1125,-340) 130(-1175,-340) 131(-1225,-340) 132(-1275,-340) 133(-1325,-340) 134(-1375,-340) 135(-1425,-340) 136(-1475,-340) 137(-1525,-340) 138(-1575,-340) 139(-1625,-340) 140(-1675,-340) 141(-1725,-340) 142(-1775,-340) 143(-1825,-340) 144(-1875,-340)
Mechanical 1:
  lines w0: 2045,-212 cw(c2107,-212) 2107,-150 ; 2045,-209 2045,-400 62,-400 ccw(c0,-400) -62,-400 -2125,-400 -2125,100 2125,100 2125,-150 2103,-150

## SIMM80L [mil]
pads (162):
  round 125 hole 125: 1(-2192,0) 1(2192,0)
  rect 41x100 smd: 1(-2075,-340) 2(-2025,-340) 3(-1975,-340) 4(-1925,-340) 5(-1875,-340) 6(-1825,-340) 7(-1775,-340) 8(-1725,-340) 9(-1675,-340) 10(-1625,-340) 11(-1575,-340) 12(-1525,-340) 13(-1475,-340) 14(-1425,-340) 15(-1375,-340) 16(-1325,-340) 17(-1275,-340) 18(-1225,-340) 19(-1175,-340) 20(-1125,-340) 21(-1075,-340) 22(-1025,-340) 23(-975,-340) 24(-925,-340) 25(-875,-340) 26(-825,-340) 27(-775,-340) 28(-725,-340) 29(-675,-340) 30(-625,-340) 31(-575,-340) 32(-525,-340) 33(-475,-340) 34(-425,-340) 35(-375,-340) 36(-325,-340) 37(-275,-340) 38(-225,-340) 39(-175,-340) 40(-125,-340) 41(125,-340) 42(175,-340) 43(225,-340) 44(275,-340) 45(325,-340) 46(375,-340) 47(425,-340) 48(475,-340) 49(525,-340) 50(575,-340) 51(625,-340) 52(675,-340) 53(725,-340) 54(775,-340) 55(825,-340) 56(875,-340) 57(925,-340) 58(975,-340) 59(1025,-340) 60(1075,-340) 61(1125,-340) 62(1175,-340) 63(1225,-340) 64(1275,-340) 65(1325,-340) 66(1375,-340) 67(1425,-340) 68(1475,-340) 69(1525,-340) 70(1575,-340) 71(1625,-340) 72(1675,-340) 73(1725,-340) 74(1775,-340) 75(1825,-340) 76(1875,-340) 77(1925,-340) 78(1975,-340) 79(2025,-340) 80(2075,-340)
  rect 41x100 smd far side: 81(-2075,-340) 82(-2025,-340) 83(-1975,-340) 84(-1925,-340) 85(-1875,-340) 86(-1825,-340) 87(-1775,-340) 88(-1725,-340) 89(-1675,-340) 90(-1625,-340) 91(-1575,-340) 92(-1525,-340) 93(-1475,-340) 94(-1425,-340) 95(-1375,-340) 96(-1325,-340) 97(-1275,-340) 98(-1225,-340) 99(-1175,-340) 100(-1125,-340) 101(-1075,-340) 102(-1025,-340) 103(-975,-340) 104(-925,-340) 105(-875,-340) 106(-825,-340) 107(-775,-340) 108(-725,-340) 109(-675,-340) 110(-625,-340) 111(-575,-340) 112(-525,-340) 113(-475,-340) 114(-425,-340) 115(-375,-340) 116(-325,-340) 117(-275,-340) 118(-225,-340) 119(-175,-340) 120(-125,-340) 121(125,-340) 122(175,-340) 123(225,-340) 124(275,-340) 125(325,-340) 126(375,-340) 127(425,-340) 128(475,-340) 129(525,-340) 130(575,-340) 131(625,-340) 132(675,-340) 133(725,-340) 134(775,-340) 135(825,-340) 136(875,-340) 137(925,-340) 138(975,-340) 139(1025,-340) 140(1075,-340) 141(1125,-340) 142(1175,-340) 143(1225,-340) 144(1275,-340) 145(1325,-340) 146(1375,-340) 147(1425,-340) 148(1475,-340) 149(1525,-340) 150(1575,-340) 151(1625,-340) 152(1675,-340) 153(1725,-340) 154(1775,-340) 155(1825,-340) 156(1875,-340) 157(1925,-340) 158(1975,-340) 159(2025,-340) 160(2075,-340)
Mechanical 1:
  lines w0: -2307,-150 cw(c-2307,-212) -2245,-212 ; -2303,-150 -2325,-150 -2325,100 2325,100 2325,-400 62,-400 ; -2245,-209 -2245,-400 -62,-400 ; -62,-400 62,-400 ; -62,-400 cw(c0,-400) 62,-400